# Altium footprint library BBC_Footprints.PcbLib: 172 footprints (part 6 of 11)
Each footprint in its own frame and in the unit in brackets; x right, y up, seen from the top. Pads: shape width x height; smd on the part's side, far side on the other; paste and mask are expansions set on the pad; w line width, h text height; cw(c..) or ccw(c..) is an arc to the next point about the centre after c.
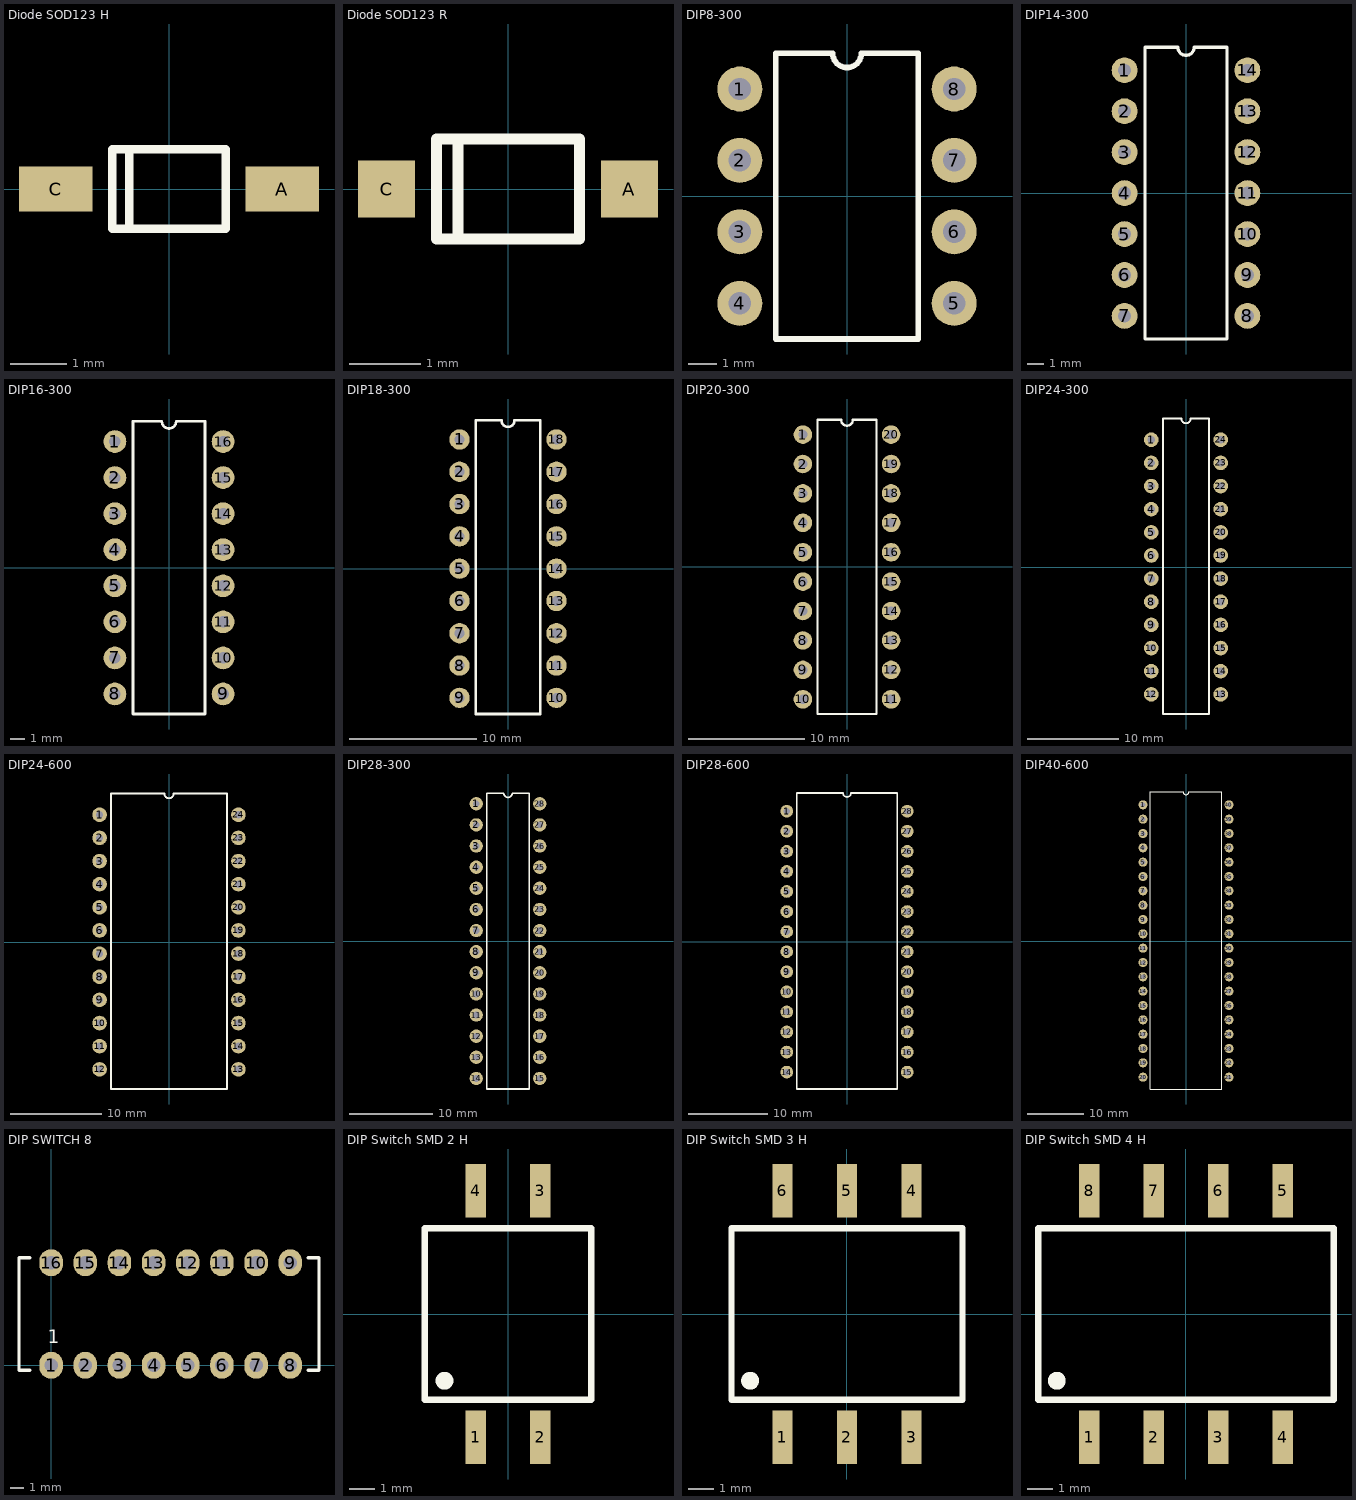
[diagram p5: the footprints below, top view; thin cyan lines are the x and y axes]

## Diode SOD123 H [mm] "Diode in SOD123 Case for hand soldering"
height 1.3
pads (2):
  rect 1.3x0.8 smd: A(2,0) C(-2,0)
Top Overlay:
  lines w0.15: -0.7,-0.698 -0.7,0.7 ; -1,-0.7 1,-0.7 1,0.7 -1,0.7 -1,-0.7
3D body "Diode SOD123.step": height 1.35, standoff 0, extent -1.85,-0.775 1.85,0.775

## Diode SOD123 R [mm] "Diode in SOD123 Case for reflow soldering"
height 1.3
pads (2):
  rect 0.8x0.8 smd: A(1.7,0) C(-1.7,0)
Top Overlay:
  lines w0.15: -0.7,-0.698 -0.7,0.7 ; -1,-0.7 -1,0.7 1,0.7 1,-0.7 -1,-0.7
3D body "Diode SOD123.step": height 1.35, standoff 0, extent -1.85,-0.775 1.85,0.775

## DIP8-300 [mm] "DIP8 300mil width"
pads (8):
  round 1.6 hole 0.8: 1(-3.81,3.81) 2(-3.81,1.27) 3(-3.81,-1.27) 4(-3.81,-3.81) 5(3.81,-3.81) 6(3.81,-1.27) 7(3.81,1.27) 8(3.81,3.81)
Top Overlay:
  lines w0.2: -2.54,-5.08 2.54,-5.08 2.54,5.08 0.508,5.08 cw(c0,5.08) -0.508,5.08 -2.54,5.08 -2.54,-5.08
3D body "DIP8-300.step": height 4.5, standoff -3.5, extent -3.88,-5.4 3.88,5.4

## DIP14-300 [mm] "DIP14 300mil width"
pads (14):
  round 1.6 hole 0.8: 1(-3.81,7.62) 2(-3.81,5.08) 3(-3.81,2.54) 4(-3.81,0) 5(-3.81,-2.54) 6(-3.81,-5.08) 7(-3.81,-7.62) 8(3.81,-7.62) 9(3.81,-5.08) 10(3.81,-2.54) 11(3.81,0) 12(3.81,2.54) 13(3.81,5.08) 14(3.81,7.62)
Top Overlay:
  lines w0.2: -2.54,-9.05 2.54,-9.05 2.54,9.05 0.508,9.05 cw(c0,9.05) -0.508,9.05 -2.54,9.05 -2.54,-9.05
3D body "DIP14-300.step": height 4.5, standoff -3.5, extent -3.88,-9.05 3.88,9.05

## DIP16-300 [mm] "DIP16 300mil width"
pads (16):
  round 1.6 hole 0.8: 1(-3.81,8.89) 2(-3.81,6.35) 3(-3.81,3.81) 4(-3.81,1.27) 5(-3.81,-1.27) 6(-3.81,-3.81) 7(-3.81,-6.35) 8(-3.81,-8.89) 9(3.81,-8.89) 10(3.81,-6.35) 11(3.81,-3.81) 12(3.81,-1.27) 13(3.81,1.27) 14(3.81,3.81) 15(3.81,6.35) 16(3.81,8.89)
Top Overlay:
  lines w0.2: -2.54,-10.3 2.54,-10.3 2.54,10.32 0.508,10.32 cw(c0,10.32) -0.508,10.32 -2.54,10.32 -2.54,-10.3
3D body "DIP16-300.step": height 4.5, standoff -3.5, extent -3.88,-10.3 3.88,10.3

## DIP18-300 [mm] "DIP18 300mil width"
pads (18):
  round 1.6 hole 0.8: 1(-3.81,10.16) 2(-3.81,7.62) 3(-3.81,5.08) 4(-3.81,2.54) 5(-3.81,0) 6(-3.81,-2.54) 7(-3.81,-5.08) 8(-3.81,-7.62) 9(-3.81,-10.16) 10(3.81,-10.16) 11(3.81,-7.62) 12(3.81,-5.08) 13(3.81,-2.54) 14(3.81,0) 15(3.81,2.54) 16(3.81,5.08) 17(3.81,7.62) 18(3.81,10.16)
Top Overlay:
  lines w0.2: -2.54,-11.43 2.54,-11.43 2.54,11.655 0.508,11.655 cw(c0,11.655) -0.508,11.655 -2.54,11.655 -2.54,-11.43
3D body "DIP18-300.step": height 5.08, standoff -2.49, extent -3.935,-11.495 3.935,11.495

## DIP20-300 [mm] "DIP20 300mil width"
pads (20):
  round 1.6 hole 0.8: 1(-3.81,11.43) 2(-3.81,8.89) 3(-3.81,6.35) 4(-3.81,3.81) 5(-3.81,1.27) 6(-3.81,-1.27) 7(-3.81,-3.81) 8(-3.81,-6.35) 9(-3.81,-8.89) 10(-3.81,-11.43) 11(3.81,-11.43) 12(3.81,-8.89) 13(3.81,-6.35) 14(3.81,-3.81) 15(3.81,-1.27) 16(3.81,1.27) 17(3.81,3.81) 18(3.81,6.35) 19(3.81,8.89) 20(3.81,11.43)
Top Overlay:
  lines w0.2: -2.54,-12.7 -2.54,12.7 -0.508,12.7 ccw(c0,12.7) 0.508,12.7 2.54,12.7 2.54,-12.7 -2.54,-12.7
3D body "DIP20-300.step": height 4.5, standoff -3.5, extent -3.88,-12.8 3.88,12.8

## DIP24-300 [mm] "DIP24 300mil width"
pads (24):
  round 1.6 hole 0.8: 1(-3.81,13.97) 2(-3.81,11.43) 3(-3.81,8.89) 4(-3.81,6.35) 5(-3.81,3.81) 6(-3.81,1.27) 7(-3.81,-1.27) 8(-3.81,-3.81) 9(-3.81,-6.35) 10(-3.81,-8.89) 11(-3.81,-11.43) 12(-3.81,-13.97) 13(3.81,-13.97) 14(3.81,-11.43) 15(3.81,-8.89) 16(3.81,-6.35) 17(3.81,-3.81) 18(3.81,-1.27) 19(3.81,1.27) 20(3.81,3.81) 21(3.81,6.35) 22(3.81,8.89) 23(3.81,11.43) 24(3.81,13.97)
Top Overlay:
  lines w0.2: -2.54,-16.13 2.54,-16.13 2.54,16.29 0.508,16.29 cw(c0,16.29) -0.508,16.29 -2.54,16.29 -2.54,-16.13
3D body "DIP24-300.step": height 5.08, standoff -2.49, extent -3.935,-16.13 3.935,16.13

## DIP24-600 [mm] "DIP24 600mil width"
pads (24):
  round 1.6 hole 0.8: 1(-7.62,13.97) 2(-7.62,11.43) 3(-7.62,8.89) 4(-7.62,6.35) 5(-7.62,3.81) 6(-7.62,1.27) 7(-7.62,-1.27) 8(-7.62,-3.81) 9(-7.62,-6.35) 10(-7.62,-8.89) 11(-7.62,-11.43) 12(-7.62,-13.97) 13(7.62,-13.97) 14(7.62,-11.43) 15(7.62,-8.89) 16(7.62,-6.35) 17(7.62,-3.81) 18(7.62,-1.27) 19(7.62,1.27) 20(7.62,3.81) 21(7.62,6.35) 22(7.62,8.89) 23(7.62,11.43) 24(7.62,13.97)
Top Overlay:
  lines w0.2: -6.35,-16.13 -6.35,16.29 -0.508,16.29 ccw(c0,16.29) 0.508,16.29 6.35,16.29 6.35,-16.13 -6.35,-16.13
3D body "DIP24-600.step": height 5.7, standoff -2.58, extent -7.745,-16.13 7.745,16.13

## DIP28-300 [mm] "DIP28 300mil width"
pads (28):
  round 1.6 hole 0.8: 1(-3.81,16.51) 2(-3.81,13.97) 3(-3.81,11.43) 4(-3.81,8.89) 5(-3.81,6.35) 6(-3.81,3.81) 7(-3.81,1.27) 8(-3.81,-1.27) 9(-3.81,-3.81) 10(-3.81,-6.35) 11(-3.81,-8.89) 12(-3.81,-11.43) 13(-3.81,-13.97) 14(-3.81,-16.51) 15(3.81,-16.51) 16(3.81,-13.97) 17(3.81,-11.43) 18(3.81,-8.89) 19(3.81,-6.35) 20(3.81,-3.81) 21(3.81,-1.27) 22(3.81,1.27) 23(3.81,3.81) 24(3.81,6.35) 25(3.81,8.89) 26(3.81,11.43) 27(3.81,13.97) 28(3.81,16.51)
Top Overlay:
  lines w0.2: -2.54,-17.78 -2.54,17.78 -0.508,17.78 ccw(c0,17.78) 0.508,17.78 2.54,17.78 2.54,-17.78 -2.54,-17.78
3D body "DIP28-300.step": height 5.08, standoff -2.49, extent -3.935,-18 3.935,18

## DIP28-600 [mm] "DIP28 600mil width"
pads (28):
  round 1.6 hole 0.8: 1(-7.62,16.51) 2(-7.62,13.97) 3(-7.62,11.43) 4(-7.62,8.89) 5(-7.62,6.35) 6(-7.62,3.81) 7(-7.62,1.27) 8(-7.62,-1.27) 9(-7.62,-3.81) 10(-7.62,-6.35) 11(-7.62,-8.89) 12(-7.62,-11.43) 13(-7.62,-13.97) 14(-7.62,-16.51) 15(7.62,-16.51) 16(7.62,-13.97) 17(7.62,-11.43) 18(7.62,-8.89) 19(7.62,-6.35) 20(7.62,-3.81) 21(7.62,-1.27) 22(7.62,1.27) 23(7.62,3.81) 24(7.62,6.35) 25(7.62,8.89) 26(7.62,11.43) 27(7.62,13.97) 28(7.62,16.51)
Top Overlay:
  lines w0.2: -6.35,-18.65 6.35,-18.65 6.35,18.81 0.508,18.81 cw(c0,18.81) -0.508,18.81 -6.35,18.81 -6.35,-18.65
3D body "DIP28-600.step": height 5.7, standoff -2.58, extent -7.745,-18.65 7.745,18.65

## DIP40-600 [mm] "DIP40 600mil width"
pads (40):
  round 1.6 hole 0.8: 1(-7.62,24.13) 2(-7.62,21.59) 3(-7.62,19.05) 4(-7.62,16.51) 5(-7.62,13.97) 6(-7.62,11.43) 7(-7.62,8.89) 8(-7.62,6.35) 9(-7.62,3.81) 10(-7.62,1.27) 11(-7.62,-1.27) 12(-7.62,-3.81) 13(-7.62,-6.35) 14(-7.62,-8.89) 15(-7.62,-11.43) 16(-7.62,-13.97) 17(-7.62,-16.51) 18(-7.62,-19.05) 19(-7.62,-21.59) 20(-7.62,-24.13) 21(7.62,-24.13) 22(7.62,-21.59) 23(7.62,-19.05) 24(7.62,-16.51) 25(7.62,-13.97) 26(7.62,-11.43) 27(7.62,-8.89) 28(7.62,-6.35) 29(7.62,-3.81) 30(7.62,-1.27) 31(7.62,1.27) 32(7.62,3.81) 33(7.62,6.35) 34(7.62,8.89) 35(7.62,11.43) 36(7.62,13.97) 37(7.62,16.51) 38(7.62,19.05) 39(7.62,21.59) 40(7.62,24.13)
Top Overlay:
  lines w0.2: -6.35,-26.225 -6.35,26.43 -0.508,26.43 ccw(c0,26.43) 0.508,26.43 6.35,26.43 6.35,-26.225 -6.35,-26.225
3D body "DIP40-600.step": height 5.7, standoff -2.58, extent -7.745,-26.225 7.745,26.225

## DIP SWITCH 8 [mm]
pads (16):
  oval 1.75x2 hole 1: 1(0,0) 2(2.54,0) 3(5.08,0) 4(7.62,0) 5(10.16,0) 6(12.7,0) 7(15.24,0) 8(17.78,0) 9(17.78,7.62) 10(15.24,7.62) 11(12.7,7.62) 12(10.16,7.62) 13(7.62,7.62) 14(5.08,7.62) 15(2.54,7.62) 16(0,7.62)
Top Overlay:
  lines w0.254: -1.599,-0.38 -2.387,-0.38 -2.387,8 -1.599,8 ; 19.125,-0.38 19.914,-0.38 19.914,8 19.125,8
  text "1" at -0.25,1.625 h1
3D body "DIP-Switch c-1825057-7-o-3d.stp": height 5.99, standoff -2.37, extent -2.387,-0.38 19.914,8

## DIP Switch SMD 2 H [mm] "Dipswitch for surface mount / hand soldering"
pads (4):
  rect 0.8x2.1 smd: 1(-1.27,-4.85) 2(1.27,-4.85) 3(1.27,4.85) 4(-1.27,4.85)
Top Overlay:
  circle w0.5: c-2.5,-2.625 r0.1
  lines w0.25: -3.275,-3.375 3.275,-3.375 3.275,3.375 -3.275,3.375 -3.275,-3.375
3D body "User Library-DIP SW 2P.step": height 4.15, standoff 0, extent -3.275,-4.95 3.275,4.95

## DIP Switch SMD 3 H [mm] "Dipswitch for surface mount / hand soldering"
pads (6):
  rect 0.8x2.1 smd: 1(-2.54,-4.85) 2(0,-4.85) 3(2.54,-4.85) 4(2.54,4.85) 5(0,4.85) 6(-2.54,4.85)
Top Overlay:
  circle w0.5: c-3.81,-2.625 r0.1
  lines w0.25: -4.545,-3.375 4.545,-3.375 4.545,3.375 -4.545,3.375 -4.545,-3.375
3D body "User Library-DIP SW 3P.step": height 4.15, standoff 0, extent -4.545,-4.95 4.545,4.95

## DIP Switch SMD 4 H [mm] "Dipswitch for surface mount / hand soldering"
pads (8):
  rect 0.8x2.1 smd: 1(-3.81,-4.85) 2(-1.27,-4.85) 3(1.27,-4.85) 4(3.81,-4.85) 5(3.81,4.85) 6(1.27,4.85) 7(-1.27,4.85) 8(-3.81,4.85)
Top Overlay:
  circle w0.5: c-5.08,-2.625 r0.1
  lines w0.25: -5.815,-3.375 -5.815,3.375 5.815,3.375 5.815,-3.375 -5.815,-3.375
3D body "User Library-DIP SW 4P.step": height 4.15, standoff 0, extent -5.815,-4.95 5.815,4.95